# Altium footprint library IC.PcbLib: 386 footprints (part 22 of 30)
Each footprint in its own frame and in the unit in brackets; x right, y up, seen from the top. Pads: shape width x height; smd on the part's side, far side on the other; paste and mask are expansions set on the pad; w line width, h text height; cw(c..) or ccw(c..) is an arc to the next point about the centre after c.
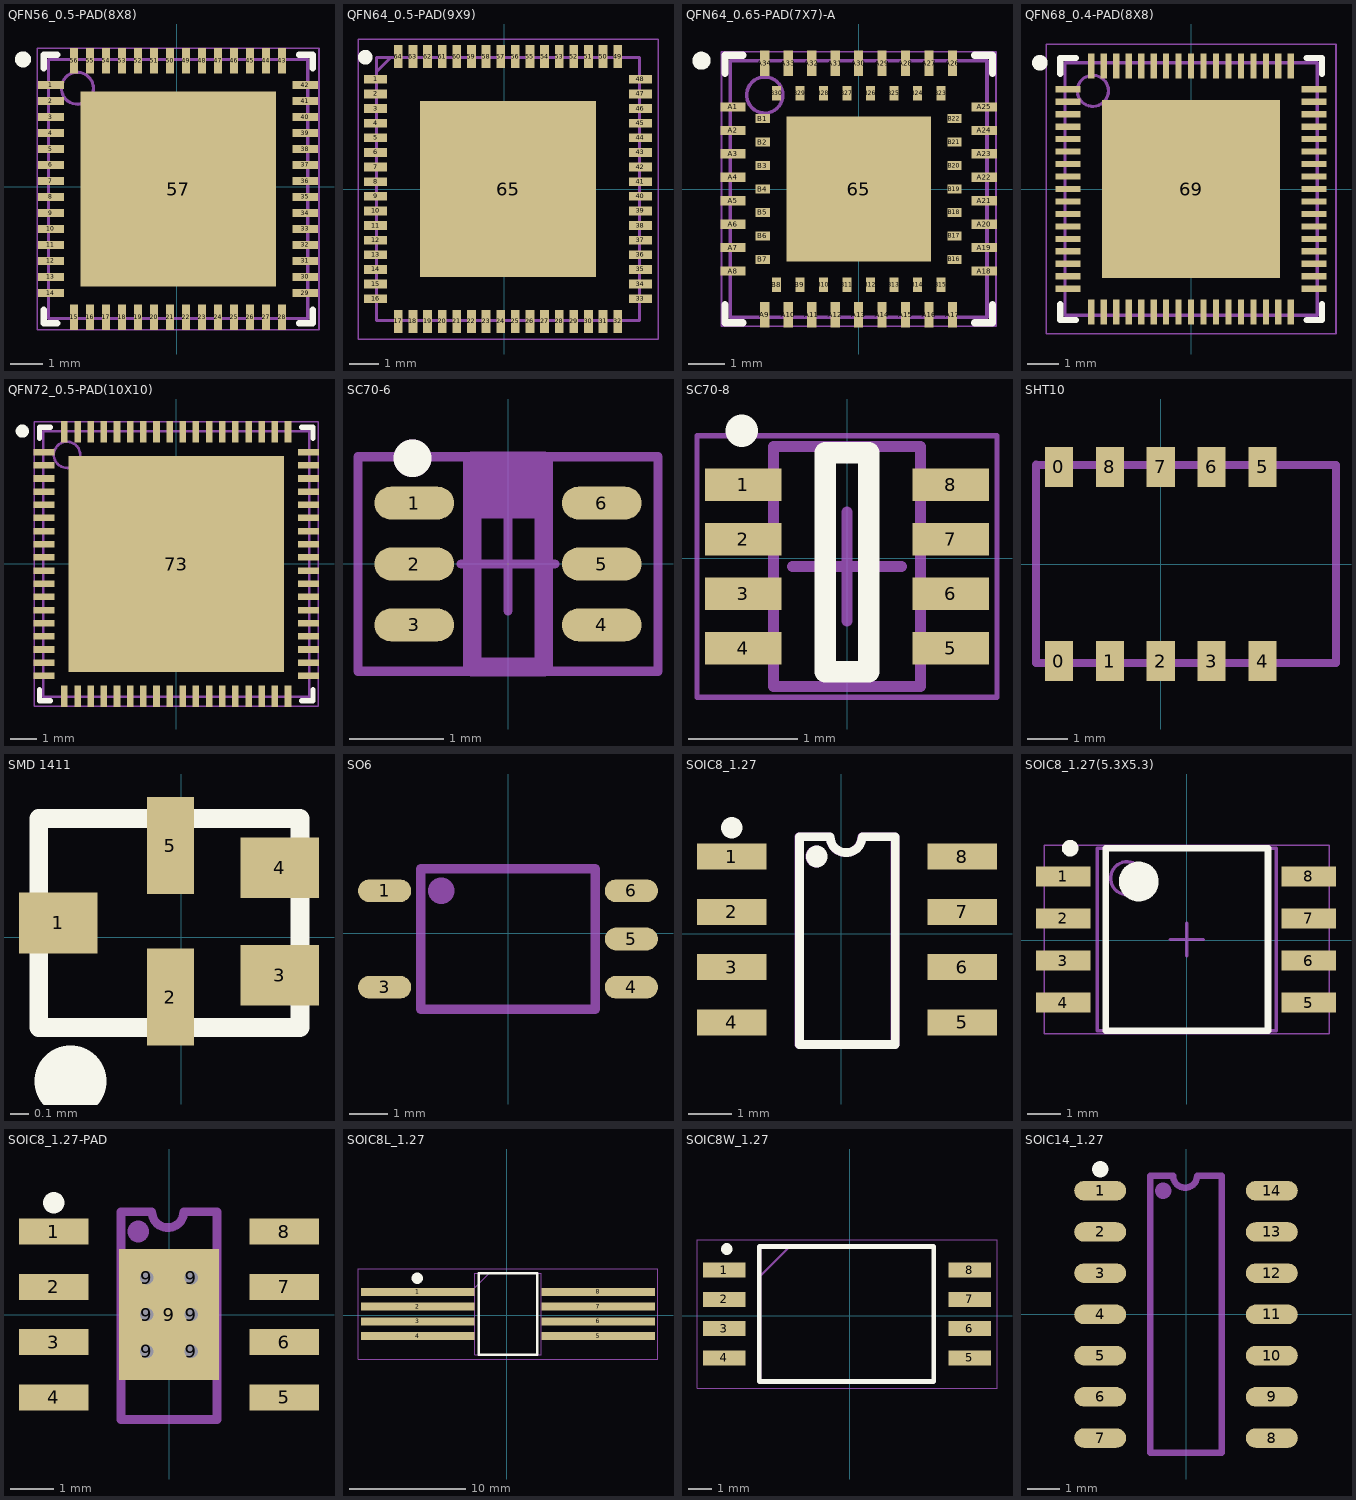
[diagram p21: the footprints below, top view; thin cyan lines are the x and y axes]

## QFN56_0.5-PAD(8X8) [mm]
height 1
pads (57):
  rect 0.8x0.25 smd: 1(-3.925,3.174) 2(-3.925,2.674) 3(-3.925,2.174) 4(-3.925,1.674) 5(-3.925,1.174) 6(-3.925,0.674) 7(-3.925,0.174) 8(-3.925,-0.326) 9(-3.925,-0.826) 10(-3.925,-1.326) 11(-3.925,-1.826) 12(-3.925,-2.326) 13(-3.925,-2.826) 14(-3.925,-3.326) 29(4.027,-3.326) 30(4.027,-2.826) 31(4.027,-2.326) 32(4.027,-1.826) 33(4.027,-1.326) 34(4.027,-0.826) 35(4.027,-0.326) 36(4.027,0.174) 37(4.027,0.674) 38(4.027,1.174) 39(4.027,1.674) 40(4.027,2.174) 41(4.027,2.674) 42(4.027,3.174)
  rect 0.25x0.8 smd: 15(-3.199,-4.078) 16(-2.699,-4.078) 17(-2.199,-4.078) 18(-1.699,-4.078) 19(-1.199,-4.078) 20(-0.699,-4.078) 21(-0.199,-4.078) 22(0.301,-4.078) 23(0.801,-4.078) 24(1.301,-4.078) 25(1.801,-4.078) 26(2.301,-4.078) 27(2.801,-4.078) 28(3.301,-4.078) 43(3.301,3.925) 44(2.801,3.925) 45(2.301,3.925) 46(1.801,3.925) 47(1.301,3.925) 48(0.801,3.925) 49(0.301,3.925) 50(-0.199,3.925) 51(-0.699,3.925) 52(-1.199,3.925) 53(-1.699,3.925) 54(-2.199,3.925) 55(-2.699,3.925) 56(-3.199,3.925)
  rect 6.1x6.1 smd: 57(0.051,-0.076)
Top Overlay:
  circle w0.25: c-4.799,3.974 r0.125
  lines w0.2: -4.149,-3.851 -4.149,-4.276 -3.724,-4.276 ; -4.149,3.699 -4.149,4.124 -3.724,4.124 ; 3.826,-4.276 4.251,-4.276 4.251,-3.851 ; 3.826,4.124 4.251,4.124 4.251,3.699
Mechanical 13:
  circle w0.1: c-3.099,3.074 r0.5
  lines w0.1: -3.999,-4.126 -3.999,3.974 4.101,3.974 4.101,-4.126 -3.999,-4.126
Mechanical 15:
  lines w0.05: -4.349,-4.476 -4.349,4.324 4.451,4.324 4.451,-4.476 -4.349,-4.476
  lines w0.1: -0.449,-0.076 0.551,-0.076 ; 0.051,-0.576 0.051,0.424
3D body "User Library-QFN56_0_5.step": height 0.95, standoff 0, extent -3.974,-4.076 4.026,3.924

## QFN64_0.5-PAD(9X9) [mm]
height 1
pads (65):
  rect 0.8x0.3 smd: 1(-4.399,3.75) 2(-4.399,3.25) 3(-4.399,2.75) 4(-4.399,2.25) 5(-4.399,1.75) 6(-4.399,1.25) 7(-4.399,0.75) 8(-4.399,0.25) 9(-4.399,-0.25) 10(-4.399,-0.75) 11(-4.399,-1.25) 12(-4.399,-1.75) 13(-4.399,-2.25) 14(-4.399,-2.75) 15(-4.399,-3.25) 16(-4.399,-3.75) 33(4.653,-3.75) 34(4.653,-3.25) 35(4.653,-2.75) 36(4.653,-2.25) 37(4.653,-1.75) 38(4.653,-1.25) 39(4.653,-0.75) 40(4.653,-0.25) 41(4.653,0.25) 42(4.653,0.75) 43(4.653,1.25) 44(4.653,1.75) 45(4.653,2.25) 46(4.653,2.75) 47(4.653,3.25) 48(4.653,3.75)
  rect 0.3x0.8 smd: 17(-3.623,-4.526) 18(-3.123,-4.526) 19(-2.623,-4.526) 20(-2.123,-4.526) 21(-1.623,-4.526) 22(-1.123,-4.526) 23(-0.623,-4.526) 24(-0.123,-4.526) 25(0.377,-4.526) 26(0.877,-4.526) 27(1.377,-4.526) 28(1.877,-4.526) 29(2.377,-4.526) 30(2.877,-4.526) 31(3.377,-4.526) 32(3.877,-4.526) 49(3.877,4.526) 50(3.377,4.526) 51(2.877,4.526) 52(2.377,4.526) 53(1.877,4.526) 54(1.377,4.526) 55(0.877,4.526) 56(0.377,4.526) 57(-0.123,4.526) 58(-0.623,4.526) 59(-1.123,4.526) 60(-1.623,4.526) 61(-2.123,4.526) 62(-2.623,4.526) 63(-3.123,4.526) 64(-3.623,4.526)
  rect 6x6 smd: 65(0.127,0)
Top Overlay:
  circle w0.25: c-4.748,4.5 r0.125
Mechanical 13:
  lines w0.1: -4.373,4 -3.873,4.5 ; -4.373,-4.5 -4.373,4.5 4.627,4.5 4.627,-4.5 -4.373,-4.5
Mechanical 15:
  lines w0.05: -4.998,-5.125 -4.998,5.125 5.252,5.125 5.252,-5.125 -4.998,-5.125
3D body "MSP430F169IRTDT.stp": height 0.9, standoff 0, extent -4.423,-4.55 4.677,4.55

## QFN64_0.65-PAD(7X7)-A [mm]
height 1
pads (65):
  rect 4x4 smd paste-2 mask+0.051: 65(0,0)
  rect 0.7x0.25 smd paste-0.125 mask+0.051: A1(-3.476,2.275) A2(-3.476,1.625) A3(-3.476,0.975) A4(-3.476,0.325) A5(-3.476,-0.325) A6(-3.476,-0.975) A7(-3.476,-1.625) A8(-3.476,-2.275) A18(3.476,-2.275) A19(3.476,-1.625) A20(3.476,-0.975) A21(3.476,-0.325) A22(3.476,0.325) A23(3.476,0.975) A24(3.476,1.625) A25(3.476,2.275)
  rect 0.25x0.7 smd paste-0.125 mask+0.051: A9(-2.6,-3.476) A10(-1.95,-3.476) A11(-1.3,-3.476) A12(-0.65,-3.476) A13(0,-3.476) A14(0.65,-3.476) A15(1.3,-3.476) A16(1.95,-3.476) A17(2.6,-3.476) A26(2.6,3.476) A27(1.95,3.476) A28(1.3,3.476) A29(0.65,3.476) A30(0,3.476) A31(-0.65,3.476) A32(-1.3,3.476) A33(-1.95,3.476) A34(-2.6,3.476)
  rect 0.4x0.25 smd mask+0.051: B1(-2.65,1.95) B2(-2.65,1.3) B3(-2.65,0.65) B4(-2.65,0) B5(-2.65,-0.65) B6(-2.65,-1.3) B7(-2.65,-1.95) B16(2.65,-1.95) B17(2.65,-1.3) B18(2.65,-0.65) B19(2.65,0) B20(2.65,0.65) B21(2.65,1.3) B22(2.65,1.95)
  rect 0.25x0.4 smd mask+0.051: B8(-2.275,-2.65) B9(-1.625,-2.65) B10(-0.975,-2.65) B11(-0.325,-2.65) B12(0.325,-2.65) B13(0.975,-2.65) B14(1.625,-2.65) B15(2.275,-2.65) B23(2.275,2.65) B24(1.625,2.65) B25(0.975,2.65) B26(0.325,2.65) B27(-0.325,2.65) B28(-0.975,2.65) B29(-1.625,2.65) B30(-2.275,2.65)
Top Overlay:
  circle w0.25: c-4.35,3.55 r0.125
  lines w0.2: -3.7,-3.2 -3.7,-3.7 -3.2,-3.7 ; -3.7,3.2 -3.7,3.7 -3.2,3.7 ; 3.2,-3.7 3.7,-3.7 3.7,-3.2 ; 3.2,3.7 3.7,3.7 3.7,3.2
Top Paste:
  region: -2.725,3.825 -2.725,3.125 -2.475,3.125 -2.475,3.825
  region: -2.075,3.825 -2.075,3.125 -1.825,3.125 -1.825,3.825
  region: -1.425,3.825 -1.425,3.125 -1.175,3.125 -1.175,3.825
  region: -0.775,3.825 -0.775,3.125 -0.525,3.125 -0.525,3.825
  region: -0.125,3.825 -0.125,3.125 0.125,3.125 0.125,3.825
  region: 0.525,3.825 0.525,3.125 0.775,3.125 0.775,3.825
  region: 1.175,3.825 1.175,3.125 1.425,3.125 1.425,3.825
  region: 1.825,3.825 1.825,3.125 2.075,3.125 2.075,3.825
  region: 3.825,2.4 3.125,2.4 3.125,2.15 3.825,2.15
  region: 3.825,1.75 3.125,1.75 3.125,1.5 3.825,1.5
  region: 3.825,1.1 3.125,1.1 3.125,0.85 3.825,0.85
  region: 3.825,0.45 3.125,0.45 3.125,0.2 3.825,0.2
  region: 3.825,-0.2 3.125,-0.2 3.125,-0.45 3.825,-0.45
  region: 3.825,-0.85 3.125,-0.85 3.125,-1.1 3.825,-1.1
  region: 3.825,-1.5 3.125,-1.5 3.125,-1.75 3.825,-1.75
  region: 3.825,-2.15 3.125,-2.15 3.125,-2.4 3.825,-2.4
  region: -2.475,-3.825 -2.475,-3.125 -2.725,-3.125 -2.725,-3.825
  region: -1.825,-3.825 -1.825,-3.125 -2.075,-3.125 -2.075,-3.825
  region: -1.175,-3.825 -1.175,-3.125 -1.425,-3.125 -1.425,-3.825
  region: -0.525,-3.825 -0.525,-3.125 -0.775,-3.125 -0.775,-3.825
  region: 0.125,-3.825 0.125,-3.125 -0.125,-3.125 -0.125,-3.825
  region: 0.775,-3.825 0.775,-3.125 0.525,-3.125 0.525,-3.825
  region: 1.425,-3.825 1.425,-3.125 1.175,-3.125 1.175,-3.825
  region: 2.075,-3.825 2.075,-3.125 1.825,-3.125 1.825,-3.825
  rectangle: -3.825,-2.4 -3.125,-2.15
  rectangle: -3.825,-1.75 -3.125,-1.5
  rectangle: -3.825,-1.1 -3.125,-0.85
  rectangle: -3.825,-0.45 -3.125,-0.2
  rectangle: -3.825,0.2 -3.125,0.45
  rectangle: -3.825,0.85 -3.125,1.1
  rectangle: -3.825,1.5 -3.125,1.75
  rectangle: -3.825,2.15 -3.125,2.4
  rectangle: 0.1,0.1 1.9,1.9
  region: -0.1,1.9 -1.9,1.9 -1.9,0.1 -0.1,0.1
  region: -0.1,-0.1 -1.9,-0.1 -1.9,-1.9 -0.1,-1.9
  rectangle: 0.1,-1.9 1.9,-0.1
  region: 2.725,-3.825 2.725,-3.125 2.475,-3.125 2.475,-3.825
  region: 2.475,3.825 2.475,3.125 2.725,3.125 2.725,3.825
Mechanical 13:
  circle w0.1: c-2.6,2.6 r0.5
  lines w0.1: -3.55,-3.55 -3.55,3.55 3.55,3.55 3.55,-3.55 -3.55,-3.55
Mechanical 15:
  lines w0.05: -3.8,-3.8 -3.8,3.8 3.8,3.8 3.8,-3.8 -3.8,-3.8
  lines w0.1: -0.5,0 0.5,0 ; 0,-0.5 0,0.5
3D body: height 1.05, standoff 0.4, extent -3.14,2.268 -2.343,3.066
3D body: height 1, standoff 0, extent -3.55,-3.55 3.55,3.55

## QFN68_0.4-PAD(8X8) [mm]
height 0.254
pads (69):
  rect 0.8x0.2 smd: 1(-3.95,3.2) 2(-3.95,2.8) 3(-3.95,2.4) 4(-3.95,2) 5(-3.95,1.6) 6(-3.95,1.2) 7(-3.95,0.8) 8(-3.95,0.4) 9(-3.95,0) 10(-3.95,-0.4) 11(-3.95,-0.8) 12(-3.95,-1.2) 13(-3.95,-1.6) 14(-3.95,-2) 15(-3.95,-2.4) 16(-3.95,-2.8) 17(-3.95,-3.2) 35(3.95,-3.2) 36(3.95,-2.8) 37(3.95,-2.4) 38(3.95,-2) 39(3.95,-1.6) 40(3.95,-1.2) 41(3.95,-0.8) 42(3.95,-0.4) 43(3.95,0) 44(3.95,0.4) 45(3.95,0.8) 46(3.95,1.2) 47(3.95,1.6) 48(3.95,2) 49(3.95,2.4) 50(3.95,2.8) 51(3.95,3.2)
  rect 0.2x0.8 smd: 18(-3.2,-3.95) 19(-2.8,-3.95) 20(-2.4,-3.95) 21(-2,-3.95) 22(-1.6,-3.95) 23(-1.2,-3.95) 24(-0.8,-3.95) 25(-0.4,-3.95) 26(0,-3.95) 27(0.4,-3.95) 28(0.8,-3.95) 29(1.2,-3.95) 30(1.6,-3.95) 31(2,-3.95) 32(2.4,-3.95) 33(2.8,-3.95) 34(3.2,-3.95) 52(3.2,3.95) 53(2.8,3.95) 54(2.4,3.95) 55(2,3.95) 56(1.6,3.95) 57(1.2,3.95) 58(0.8,3.95) 59(0.4,3.95) 60(0,3.95) 61(-0.4,3.95) 62(-0.8,3.95) 63(-1.2,3.95) 64(-1.6,3.95) 65(-2,3.95) 66(-2.4,3.95) 67(-2.8,3.95) 68(-3.2,3.95)
  rect 5.7x5.7 smd: 69(0,0)
Top Overlay:
  circle w0.25: c-4.85,4.05 r0.125
  lines w0.2: -4.2,-3.7 -4.2,-4.2 -3.7,-4.2 ; -4.2,3.7 -4.2,4.2 -3.7,4.2 ; 3.7,-4.2 4.2,-4.2 4.2,-3.7 ; 3.7,4.2 4.2,4.2 4.2,3.7
Mechanical 13:
  circle w0.1: c-3.15,3.15 r0.5
  lines w0.1: -4.05,-4.05 -4.05,4.05 4.05,4.05 4.05,-4.05 -4.05,-4.05
Mechanical 15:
  lines w0.05: -4.65,-4.65 -4.65,4.65 4.65,4.65 4.65,-4.65 -4.65,-4.65
  lines w0.1: -0.5,0 0.5,0 ; 0,-0.5 0,0.5
3D body "User Library-QFN68(8x8mm).step": height 0.85, standoff 0, extent -4.02,-4.02 4.02,4.02

## QFN72_0.5-PAD(10X10) [mm]
height 1
pads (73):
  rect 0.8x0.25 smd: 1(-5.022,4.248) 2(-5.022,3.748) 3(-5.022,3.248) 4(-5.022,2.748) 5(-5.022,2.248) 6(-5.022,1.748) 7(-5.022,1.248) 8(-5.022,0.748) 9(-5.022,0.248) 10(-5.022,-0.252) 11(-5.022,-0.752) 12(-5.022,-1.252) 13(-5.022,-1.752) 14(-5.022,-2.252) 15(-5.022,-2.752) 16(-5.022,-3.252) 17(-5.022,-3.752) 18(-5.022,-4.252) 37(5.032,-4.252) 38(5.032,-3.752) 39(5.032,-3.252) 40(5.032,-2.752) 41(5.032,-2.252) 42(5.032,-1.752) 43(5.032,-1.252) 44(5.032,-0.752) 45(5.032,-0.252) 46(5.032,0.248) 47(5.032,0.748) 48(5.032,1.248) 49(5.032,1.748) 50(5.032,2.248) 51(5.032,2.748) 52(5.032,3.248) 53(5.032,3.748) 54(5.032,4.248)
  rect 0.25x0.8 smd: 19(-4.245,-5.029) 20(-3.745,-5.029) 21(-3.245,-5.029) 22(-2.745,-5.029) 23(-2.245,-5.029) 24(-1.745,-5.029) 25(-1.245,-5.029) 26(-0.745,-5.029) 27(-0.245,-5.029) 28(0.255,-5.029) 29(0.755,-5.029) 30(1.255,-5.029) 31(1.755,-5.029) 32(2.255,-5.029) 33(2.755,-5.029) 34(3.255,-5.029) 35(3.755,-5.029) 36(4.255,-5.029) 55(4.255,5.025) 56(3.755,5.025) 57(3.255,5.025) 58(2.755,5.025) 59(2.255,5.025) 60(1.755,5.025) 61(1.255,5.025) 62(0.755,5.025) 63(0.255,5.025) 64(-0.245,5.025) 65(-0.745,5.025) 66(-1.245,5.025) 67(-1.745,5.025) 68(-2.245,5.025) 69(-2.745,5.025) 70(-3.245,5.025) 71(-3.745,5.025) 72(-4.245,5.025)
  rect 8.2x8.2 smd: 73(0.005,-0.002)
Top Overlay:
  circle w0.25: c-5.845,5.048 r0.125
  lines w0.2: -5.195,-4.777 -5.195,-5.202 -4.77,-5.202 ; -5.195,4.773 -5.195,5.198 -4.77,5.198 ; 4.78,-5.202 5.205,-5.202 5.205,-4.777 ; 4.78,5.198 5.205,5.198 5.205,4.773
Mechanical 13:
  circle w0.1: c-4.145,4.148 r0.5
  lines w0.1: -5.045,-5.052 -5.045,5.048 5.055,5.048 5.055,-5.052 -5.045,-5.052
Mechanical 15:
  lines w0.05: -5.395,-5.402 -5.395,5.398 5.405,5.398 5.405,-5.402 -5.395,-5.402
  lines w0.1: -0.495,-0.002 0.505,-0.002 ; 0.005,-0.502 0.005,0.498
3D body "QFN50P1000X1000X80_HS-73N.step": height 0.8, standoff 0, extent -5.01,-5.01 5.01,5.01

## SC70-6 [mm] "SOT23, 6-Leads, Body 2.2x2.4mm (max), Pitch 0.65mm, IPC Medium Density"
height 1.1
pads (6):
  oval 0.85x0.35 smd: 1(-1,0.65) 2(-1,0) 3(-1,-0.65) 4(1,-0.65) 5(1,0) 6(1,0.65)
Top Overlay:
  lines w0.4: -1.019,1.128 -1.019,1.129
Mechanical 15:
  lines w0.1: -0.5,0 0.5,0 ; 0,-0.5 0,0.5 ; -1.6,-1.143 1.6,-1.143 1.6,1.143 -1.6,1.143 -1.6,-1.143
  lines w0.2: -0.381,0.584 0.381,0.584 ; -0.381,0.762 0.381,0.762 ; -0.381,0.914 0.381,0.914 ; -0.381,-1.1 -0.381,1.1 0.381,1.1 0.381,-1.1 -0.381,-1.1
  lines w0.4: -1.019,1.128 -1.019,1.129
3D body "sot363.STEP": height 1, standoff 0, extent -1.15,-1.05 1.15,1.05

## SC70-8 [mm]
height 1.1
pads (8):
  rect 0.7x0.3 smd: 1(-0.95,0.674) 2(-0.95,0.174) 3(-0.95,-0.326) 4(-0.95,-0.826) 5(0.95,-0.826) 6(0.95,-0.326) 7(0.95,0.174) 8(0.95,0.674)
Top Overlay:
  lines w0.2: -0.2,-1.041 0.2,-1.041 0.2,0.965 -0.2,0.965 -0.2,-1.041
  lines w0.3: -0.966,1.168 -0.965,1.168
Mechanical 13:
  lines w0.1: -0.675,-1.176 -0.675,1.024 0.675,1.024 0.675,-1.176 -0.675,-1.176
Mechanical 15:
  lines w0.05: -1.375,-1.276 -1.375,1.124 1.375,1.124 1.375,-1.276 -1.375,-1.276
  lines w0.1: -0.5,-0.076 0.5,-0.076 ; 0,-0.576 0,0.424
3D body "User Library-SC 70-8.step": height 0.9, standoff -0.02, extent -1.05,-1.076 1.05,0.924

## SHT10 [mm]
pads (10):
  rect 0.7x1 smd: 0(-2.54,-2.419) 0(-2.54,2.419) 1(-1.27,-2.419) 2(0,-2.419) 3(1.27,-2.419) 4(2.54,-2.419) 5(2.54,2.419) 6(1.27,2.419) 7(0,2.419) 8(-1.27,2.419)
Mechanical 15:
  lines w0.203: -3.11,-2.47 4.37,-2.47 4.37,2.47 -3.11,2.47 ; -3.11,-2.464 -3.11,2.476
3D body: height 0.8, standoff 0, extent -3.11,-2.464 4.37,2.47
3D body: height 2.6, standoff 0.7, extent -2.159,-1.647 4.256,1.654
3D body: height 2.61, standoff 0.7, extent -1.626,-1.013 -0.914,1.019

## SMD 1411 [mm]
pads (5):
  rect 0.42x0.325 smd paste+0 mask+0.05: 1(-0.658,0.076) 3(0.526,-0.203) 4(0.526,0.371)
  rect 0.25x0.52 smd paste+0 mask+0.05: 2(-0.058,-0.32) 5(-0.058,0.49)
Top Overlay:
  lines w0.1: -0.762,-0.483 0.635,-0.483 0.635,0.635 -0.762,0.635 -0.762,-0.483
  lines w0.381: -0.594,-0.77 -0.589,-0.77
3D body: height 0.5, standoff 0, extent -0.787,-0.49 0.653,0.655
3D body: height 0.51, standoff 0.1, extent -0.652,-0.424 -0.413,-0.185

## SO6 [mm]
pads (5):
  oval 1.4x0.6 smd: 1(-3.25,1.118) 3(-3.25,-1.422) 4(3.25,-1.422) 5(3.25,-0.152) 6(3.25,1.118)
Mechanical 15:
  lines w0.254: -2.3,-2.002 2.3,-2.002 2.3,1.698 -2.3,1.698 -2.3,-2.002
  lines w0.7: -1.756,1.117 -1.755,1.118
3D body "SO6（TLP2362 TLP113）.STEP": height 2.21, standoff 0.01, extent -3.475,-2.105 3.475,1.595

## SOIC8_1.27 [mm] "SOP, 8-Leads, Pitch 1.27mm"
pads (8):
  rect 1.6x0.6 smd: 1(-2.518,1.778) 2(-2.518,0.508) 3(-2.518,-0.762) 4(-2.518,-2.032) 5(2.772,-2.032) 6(2.772,-0.762) 7(2.772,0.508) 8(2.772,1.778)
Top Overlay:
  lines w0.2: -0.965,-2.54 1.235,-2.54 1.235,2.235 0.474,2.235 cw(c0.108,2.235) -0.259,2.235 -0.965,2.235 -0.965,-2.54
  lines w0.5: -2.518,2.438 -2.517,2.438 ; -0.57,1.778 -0.569,1.778
Mechanical 15:
  lines w0.2: -0.973,-2.54 -0.973,2.235 -0.267,2.235 ccw(c0.1,2.235) 0.466,2.235 1.227,2.235 1.227,-2.54 -0.973,-2.54
  lines w0.5: -0.578,1.778 -0.577,1.778
3D body "SOIC-8.STEP": height 1.75, standoff 0, extent -2.873,-2.577 3.127,2.323

## SOIC8_1.27(5.3X5.3) [mm]
pads (8):
  rect 1.65x0.6 smd: 1(-3.728,1.93) 2(-3.728,0.66) 3(-3.728,-0.61) 4(-3.728,-1.88) 5(3.677,-1.88) 6(3.677,-0.61) 7(3.677,0.66) 8(3.677,1.93)
Top Overlay:
  circle w0.6: c-1.45,1.775 r0.3
  circle w0.25: c-3.525,2.78 r0.125
  lines w0.2: -2.45,-2.725 2.45,-2.725 2.45,2.775 -2.45,2.775 -2.45,-2.725
Mechanical 13:
  circle w0.1: c-1.8,1.875 r0.5
  lines w0.1: -2.7,-2.725 2.7,-2.725 2.7,2.775 -2.7,2.775 -2.7,-2.725
Mechanical 15:
  lines w0.05: -4.3,-2.825 4.3,-2.825 4.3,2.875 -4.3,2.875 -4.3,-2.825
  lines w0.1: -0.5,0.025 0.5,0.025 ; 0,-0.475 0,0.525
3D body "User Library-SOIC-8-2.step": height 2.58, standoff 0, extent -4.025,-2.6 3.975,2.65

## SOIC8_1.27-PAD [mil]
pads (15):
  rect 62.99x23.62 smd: 1(-104.13,75) 2(-104.13,25) 3(-104.13,-25) 4(-104.13,-75) 5(104.13,-75) 6(104.13,-25) 7(104.13,25) 8(104.13,75)
  round 24 hole 12: 9(-20,-33.33) 9(-20,0) 9(-20,33.33) 9(20,-33.33) 9(20,0) 9(20,33.33)
  rect 90.55x118.11 smd paste-78.74: 9(0,0)
Top Overlay:
  lines w19.68: -104.14,101 -104.11,100.98
Top Paste:
  region: 43,56 4.92,56 4.92,4.92 43,4.92
  rectangle: -43,4.92 -4.92,56
  rectangle: -43,-56 -4.92,-4.92
  region: 43,-4.92 4.92,-4.92 4.92,-56 43,-56
Mechanical 15:
  lines w7.87: -43.31,-95 -43.31,93 -15.51,93 ccw(c-1.07,93) 13.36,93 43.31,93 43.31,-95 -43.31,-95
  lines w19.68: -27.74,75.01 -27.71,74.99
3D body "SOIC-8-1.STEP": height 68.9, standoff 0, extent -117.89,-96.46 118.33,96.46

## SOIC8L_1.27 [mm]
pads (8):
  rect 9.825x0.7 smd: 1(-7.661,2.007) 2(-7.661,0.737) 3(-7.661,-0.533) 4(-7.661,-1.803) 5(7.915,-1.803) 6(7.915,-0.533) 7(7.915,0.737) 8(7.915,2.007)
Top Overlay:
  lines w0.2: -2.398,-3.416 2.652,-3.416 2.652,3.62 -2.398,3.62 -2.398,-3.416
  lines w1: -7.696,3.197 -7.696,3.198
Mechanical 13:
  lines w0.1: -2.748,2.35 -1.478,3.62 ; -2.748,-3.416 3.002,-3.416 3.002,3.62 -2.748,3.62 -2.748,-3.416
Mechanical 15:
  lines w0.05: -12.823,-3.818 13.077,-3.818 13.077,4.022 -12.823,4.022 -12.823,-3.818
3D body "REF5025SHKJ.stp": height 2.21, standoff 0, extent -10.623,-3.416 10.877,3.619

## SOIC8W_1.27 [mm]
pads (8):
  rect 1.85x0.65 smd: 1(-5.452,1.981) 2(-5.452,0.711) 3(-5.452,-0.559) 4(-5.452,-1.829) 5(5.198,-1.829) 6(5.198,-0.559) 7(5.198,0.711) 8(5.198,1.981)
Top Overlay:
  lines w0.2: -3.937,-2.849 3.632,-2.849 3.632,3.001 -3.937,3.001 -3.937,-2.849
  lines w0.5: -5.334,2.892 -5.333,2.893
Mechanical 13:
  lines w0.1: -3.877,1.731 -2.607,3.001 ; -3.877,-2.849 3.623,-2.849 3.623,3.001 -3.877,3.001 -3.877,-2.849
Mechanical 15:
  lines w0.05: -6.627,-3.149 6.373,-3.149 6.373,3.301 -6.627,3.301 -6.627,-3.149
3D body "AMC1200BDWVR.stp": height 2.8, standoff 0, extent -5.877,-2.849 5.623,3.001

## SOIC14_1.27 [mm]
pads (14):
  oval 1.6x0.6 smd: 1(-2.645,3.81) 2(-2.645,2.54) 3(-2.645,1.27) 4(-2.645,0) 5(-2.645,-1.27) 6(-2.645,-2.54) 7(-2.645,-3.81) 8(2.645,-3.81) 9(2.645,-2.54) 10(2.645,-1.27) 11(2.645,0) 12(2.645,1.27) 13(2.645,2.54) 14(2.645,3.81)
Top Overlay:
  lines w0.5: -2.645,4.47 -2.644,4.47
Mechanical 15:
  lines w0.2: -1.1,-4.267 1.1,-4.267 1.1,4.267 0.339,4.267 cw(c-0.027,4.267) -0.394,4.267 -1.1,4.267 -1.1,-4.267
  lines w0.5: -0.705,3.81 -0.704,3.81
3D body "SOIC14.STEP": height 1.75, standoff 0, extent -2.909,-4.24 2.891,4.29